# Altium footprint library 电池座.PcbLib: 8 footprints
Each footprint in its own frame and in the unit in brackets; x right, y up, seen from the top. Pads: shape width x height; smd on the part's side, far side on the other; paste and mask are expansions set on the pad; w line width, h text height; cw(c..) or ccw(c..) is an arc to the next point about the centre after c.
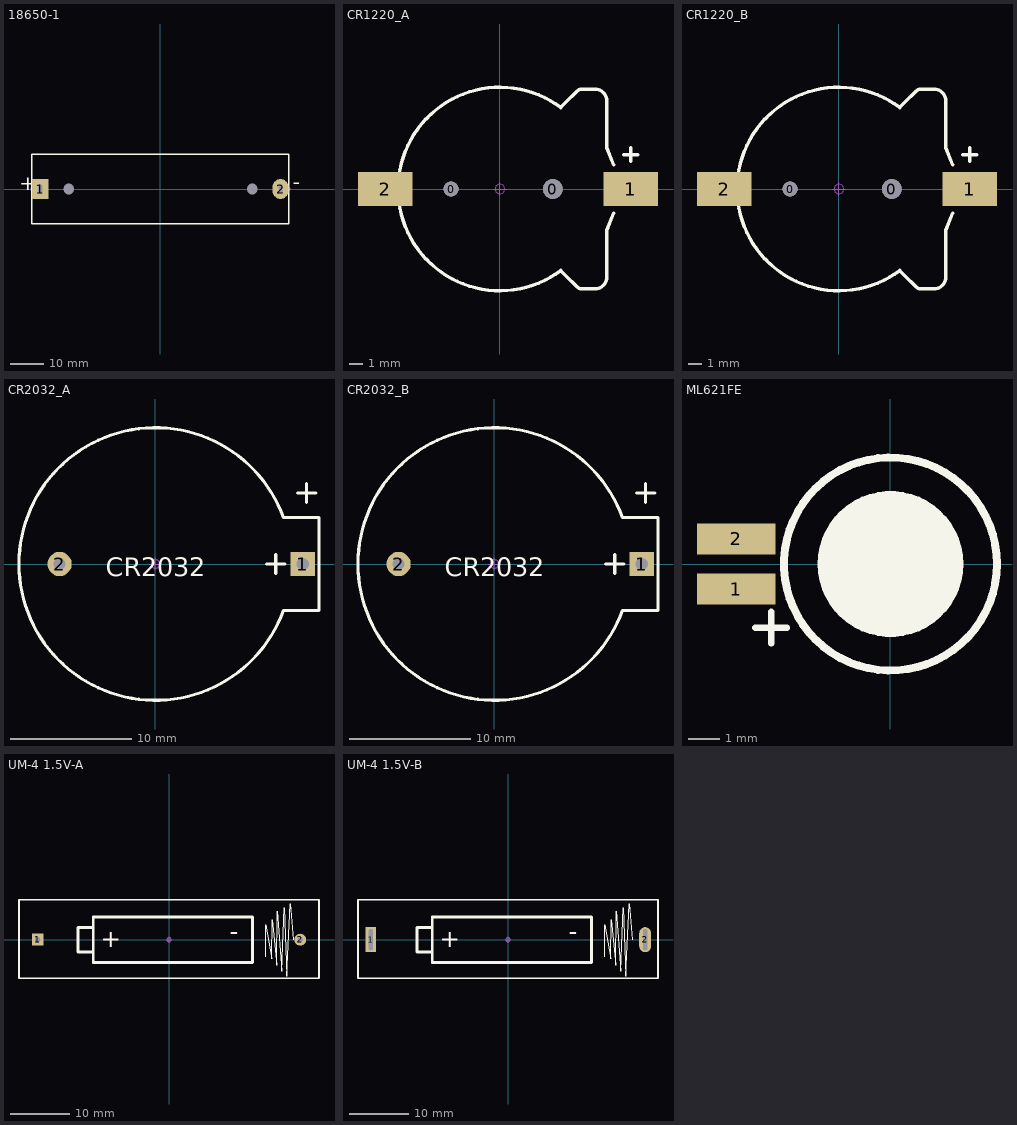
[diagram p0: the footprints below, top view; thin cyan lines are the x and y axes]

## 18650-1 [mm] "18650单节电池盒"
pads (4):
  round 0 hole 3.2: 0(-27.805,0) 0(27.805,0)
  rect 5x6 hole 1.2 slot 2.6 at 90 deg: 1(-36.45,0)
  oval 5x6 hole 1.2 slot 2.6 at 90 deg: 2(36.45,0)
Top Overlay:
  lines w0.381: -39,-10.5 -39,10.5 39,10.5 39,-10.5 -39,-10.5
  text "-" at 40.132,-1.778 h8
  text "+" at -42.926,-2.032 h8
Mechanical 15:
  circle w0.05: c39,0 r0.35
  circle w0.05: c-39,0 r0.35
  lines w0.05: -39.5,0 -38.5,0 ; -39,-0.5 -39,0.5 ; 38.5,0 39.5,0 ; 39,-0.5 39,0.5
3D body "User Library-18650 Full.STEP": height 21.65, standoff -3.83, extent -38.82,-10.4 38.83,10.4

## CR1220_A [mm] "纽扣电池座"
pads (4):
  round 1.1 hole 1.1: 0(-3.6,0)
  round 1.45 hole 1.45: 0(3.9,0)
  rect 4x2.5 smd: 1(9.652,0) 2(-8.458,0)
Top Overlay:
  lines w0.254: 4.5,-6 cw(c0,0) 4.5,6 ; 4.572,-6.096 4.826,-6.35 5.662,-7.186 ccw(c6.096,-6.753) 6.096,-7.366 7.007,-7.366 ccw(c7.007,-6.499) 7.874,-6.499 7.874,-3.048 8.382,-1.778 ; 4.572,6.096 4.826,6.35 5.662,7.186 cw(c6.096,6.753) 6.096,7.366 7.007,7.366 cw(c7.007,6.499) 7.874,6.499 7.874,3.048 8.382,1.778 ; 9.144,2.54 10.16,2.54 ; 9.652,2.032 9.652,3.048
Mechanical 15:
  circle w0.05: c0,0 r0.35
  lines w0.05: -0.5,0 0.5,0 ; 0,-0.5 0,0.5
3D body "CR1220_A.STEP": height 4.05, standoff -0.85, extent -9.416,-7.45 10.34,7.45

## CR1220_B [mm] "纽扣电池座"
pads (4):
  round 1.1 hole 1.1: 0(-3.6,0)
  round 1.45 hole 1.45: 0(3.9,0)
  rect 4x2.5 smd: 1(9.652,0) 2(-8.458,0)
Top Overlay:
  lines w0.254: 4.5,-6 cw(c0,0) 4.5,6 ; 4.572,-6.096 4.826,-6.35 5.662,-7.186 ccw(c6.096,-6.753) 6.096,-7.366 7.007,-7.366 ccw(c7.007,-6.499) 7.874,-6.499 7.874,-3.048 8.382,-1.778 ; 4.572,6.096 4.826,6.35 5.662,7.186 cw(c6.096,6.753) 6.096,7.366 7.007,7.366 cw(c7.007,6.499) 7.874,6.499 7.874,3.048 8.382,1.778 ; 9.144,2.54 10.16,2.54 ; 9.652,2.032 9.652,3.048
Mechanical 15:
  circle w0.05: c0,0 r0.35
  lines w0.05: -0.5,0 0.5,0 ; 0,-0.5 0,0.5
3D body "CR1220_B.STEP": height 4.05, standoff -0.85, extent -9.416,-7.45 10.34,7.45

## CR2032_A [mm] "纽扣电池座"
pads (2):
  rect 2x2 hole 1: 1(12.126,0)
  round 2 hole 1: 2(-7.874,0)
Top Overlay:
  lines w0.254: 9.144,0 10.668,0 ; 9.906,-0.762 9.906,0.762 ; 11.684,5.842 13.208,5.842 ; 12.446,5.08 12.446,6.604 ; 10.541,-3.81 cw(c0,0) 10.541,3.81 13.462,3.81 13.462,-3.81 10.541,-3.81
  text "CR2032" at -4.064,-1.016 h1.52
Mechanical 15:
  circle w0.05: c0,0 r0.35
  lines w0.05: -0.5,0 0.5,0 ; 0,-0.5 0,0.5
3D body "CR2032_A.STEP": height 8.75, standoff -3.05, extent -11.1,-11.099 13.3,11.099

## CR2032_B [mm] "纽扣电池座"
pads (2):
  rect 2x2 hole 1: 1(12.126,0)
  round 2 hole 1: 2(-7.874,0)
Top Overlay:
  lines w0.254: 9.144,0 10.668,0 ; 9.906,-0.762 9.906,0.762 ; 11.684,5.842 13.208,5.842 ; 12.446,5.08 12.446,6.604 ; 10.541,-3.81 cw(c0,0) 10.541,3.81 13.462,3.81 13.462,-3.81 10.541,-3.81
  text "CR2032" at -4.064,-1.016 h1.52
Mechanical 15:
  circle w0.05: c0,0 r0.35
  lines w0.05: -0.5,0 0.5,0 ; 0,-0.5 0,0.5
3D body "CR2032_B.STEP": height 8.75, standoff -3.05, extent -11.1,-11.099 13.3,11.099

## ML621FE [mm] "可充电纽扣电池"
pads (2):
  rect 2.5x1 smd: 1(-4.927,-0.8) 2(-4.927,0.8)
Top Overlay:
  circle w0.254: c0,0 r3.4
  circle w0.254: c0,0 r2.2
  circle w2.2: c0,0 r1.024
  lines w0.203: -4.318,-2.032 -3.302,-2.032 ; -3.81,-2.54 -3.81,-1.524
Mechanical 15:
  circle w0.05: c0,0 r0.35
  lines w0.05: -0.5,0 0.5,0 ; 0,-0.5 0,0.5
3D body "ML621FE.STEP": height 2.45, standoff 0.04, extent -5.5,-3.398 3.398,3.398

## UM-4 1.5V-A [mm] "7号电池盒"
height 10
pads (2):
  rect 2x2 hole 0.9: 1(-22,0.001)
  round 2 hole 0.85: 2(22,-0.001)
Top Overlay:
  lines w0.2: 16.25,-2.894 16.25,2.516 17.266,-3.174 17.291,3.303 18.104,-4.317 18.18,4.776 18.917,-5.307 19.323,5.386 19.78,-6.095 20.339,6.046 20.847,-0.024
  lines w0.254: -25.146,-6.501 -25.146,6.731 25.146,6.731 25.146,-6.501 -25.146,-6.501
  lines w0.5: -12.7,-2.032 -15.24,-2.032 -15.24,2.032 -12.7,2.032 ; -12.7,-2.032 -12.7,-3.81 13.97,-3.81 13.97,3.81 -12.7,3.81 -12.7,2.032 ; -12.7,-2.032 -12.7,2.032
  text "+" at -11.43,-1.27 h3
  text "-" at 10.16,0 h3
Mechanical 15:
  circle w0.05: c0,0 r0.35
  lines w0.05: -0.5,0 0.5,0 ; 0,-0.5 0,0.5
3D body "UM-1.5V.STEP": height 12.55, standoff -3.55, extent -25,-6.65 25,6.65

## UM-4 1.5V-B [mm] "7号电池盒"
height 10
pads (2):
  rect 1.8x4.2 hole 0.7 slot 3.5 at 90 deg: 1(-23,0)
  oval 2x4.2 hole 0.7 slot 3.5 at 90 deg: 2(23,0)
Top Overlay:
  lines w0.2: 16.25,-2.894 16.25,2.516 17.266,-3.174 17.291,3.303 18.104,-4.317 18.18,4.776 18.917,-5.307 19.323,5.386 19.78,-6.095 20.339,6.046 20.847,-0.024
  lines w0.254: -25.146,-6.501 -25.146,6.731 25.146,6.731 25.146,-6.501 -25.146,-6.501
  lines w0.5: -12.7,-2.032 -15.24,-2.032 -15.24,2.032 -12.7,2.032 ; -12.7,-2.032 -12.7,-3.81 13.97,-3.81 13.97,3.81 -12.7,3.81 -12.7,2.032 ; -12.7,-2.032 -12.7,2.032
  text "+" at -11.43,-1.27 h3
  text "-" at 10.16,0 h3
Mechanical 15:
  circle w0.05: c0,0 r0.35
  lines w0.05: -0.5,0 0.5,0 ; 0,-0.5 0,0.5
3D body "UM-1.5V-B.STEP": height 12.55, standoff -3.95, extent -25,-6.65 25,6.65